# Altium footprint library Capacitance_PcbLib.PcbLib: 22 footprints (part 1 of 2)
Each footprint in its own frame and in the unit in brackets; x right, y up, seen from the top. Pads: shape width x height; smd on the part's side, far side on the other; paste and mask are expansions set on the pad; w line width, h text height; cw(c..) or ccw(c..) is an arc to the next point about the centre after c.
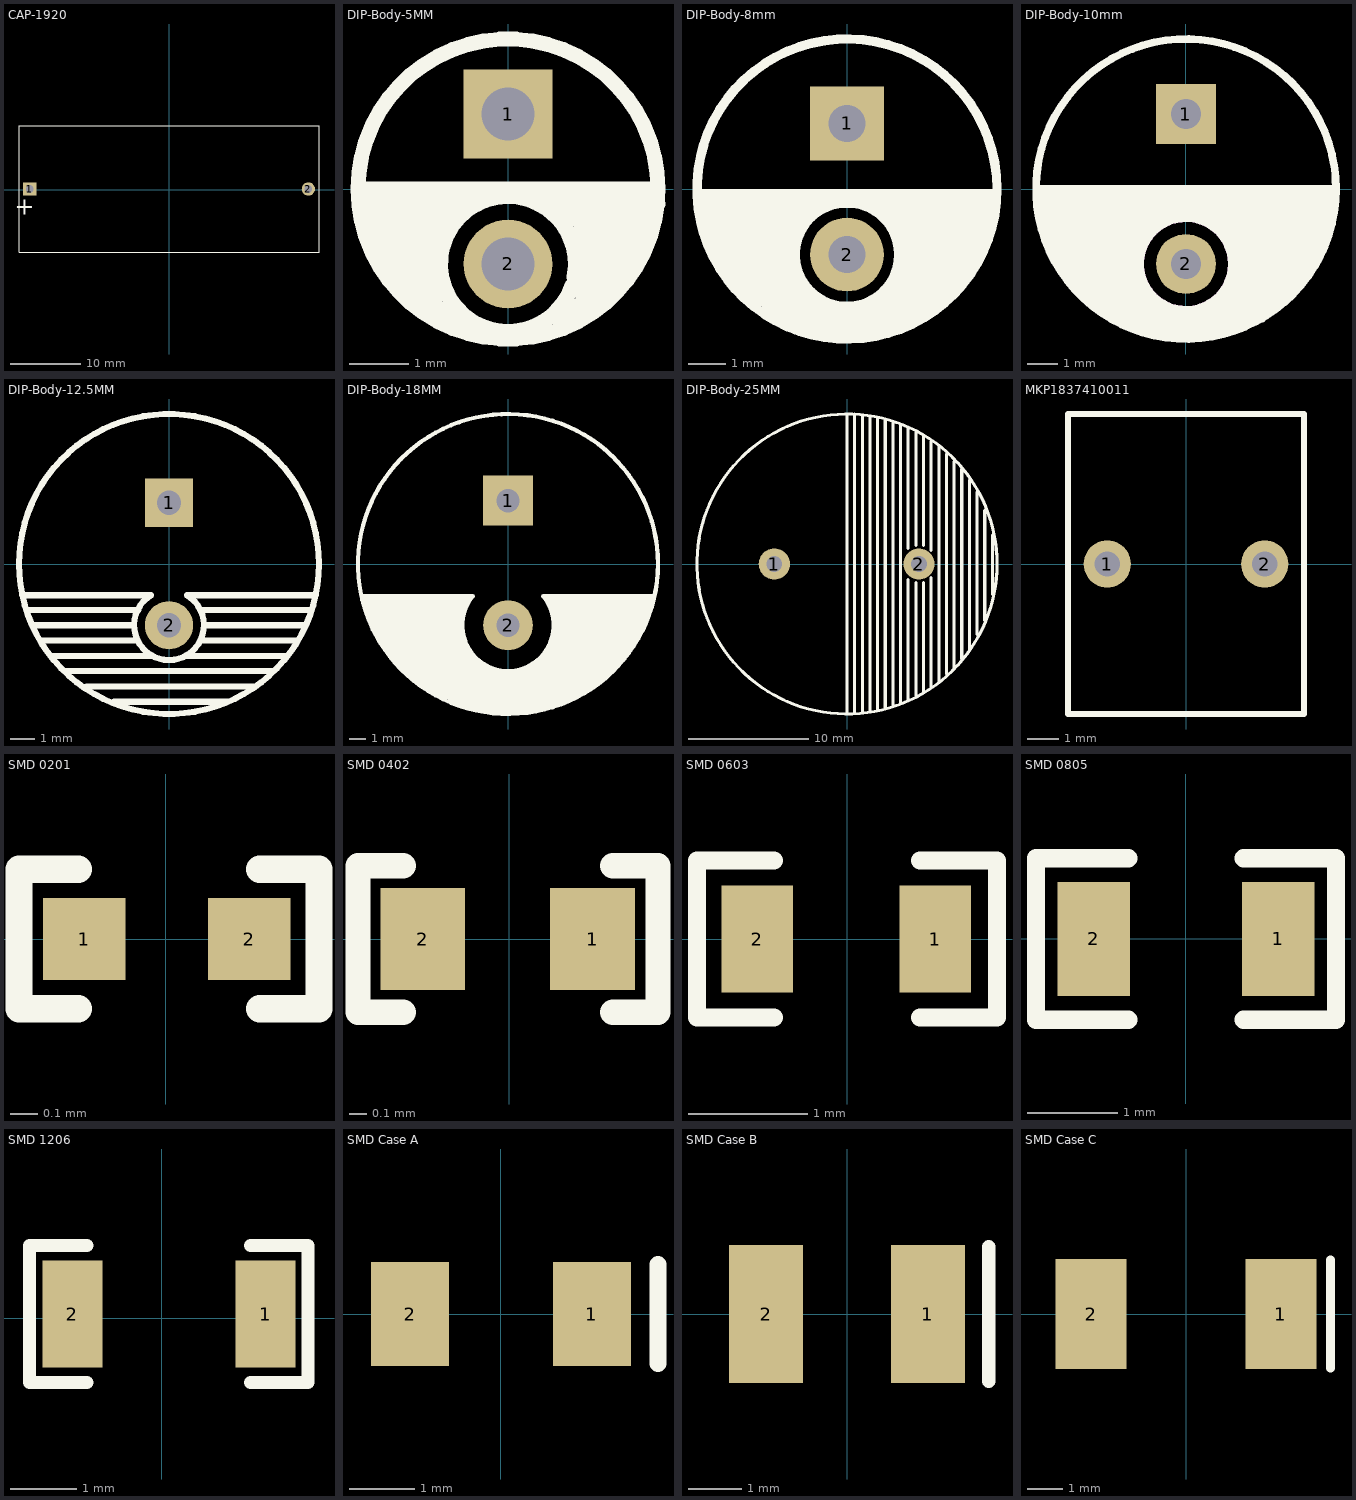
[diagram p0: the footprints below, top view; thin cyan lines are the x and y axes]

## CAP-1920 [mm] "電解電容器 - 帶引線 18x41"
pads (2):
  rect 1.9x1.9 hole 1.1: 1(-19.939,0.127)
  round 1.9 hole 1.1: 2(19.939,0.127)
Top Overlay:
  lines w0.15: -21.463,-8.89 -21.463,9.144 21.463,9.144 21.463,-8.89 -21.463,-8.89
  text "+" at -19.177,-3.556 h2.5
3D body: height 19, standoff -5, extent -20.5,-8.89 20.5,9.11

## DIP-Body-5MM [mm] "電解電容，直®"
pads (2):
  rect 1.5x1.5 hole 0.9: 1(0,1.27)
  round 1.5 hole 0.9: 2(0,-1.27)
Top Overlay:
  circle w0.254: c0,0 r2.54
  lines w0.254: -2.54,0 2.54,0 ; -2.413,-0.762 -1.016,-0.762 ; -2.413,-0.508 -0.889,-0.508 ; -2.413,-0.254 -0.508,-0.254 ; -2.286,-1.016 -1.143,-1.016 ; -2.159,-1.27 -1.143,-1.27 ; -2.032,-1.524 -1.143,-1.524 ; -1.778,-1.778 -1.143,-1.778 ; -1.524,-1.778 -1.524,-1.905 -1.397,-2.032 -1.016,-2.032 -1.016,-2.286 -0.762,-2.286 ; 0.508,-0.254 2.54,-0.254 ; 0.889,-2.286 1.27,-1.905 1.397,-1.905 1.651,-1.651 ; 0.889,-0.508 2.413,-0.508 ; 1.084,-1.631 cw(c0,-1.27) 1.121,-1.494 ; 1.143,-0.889 1.143,-0.762 2.413,-0.762 ; 1.27,-2.159 1.27,-1.016 2.286,-1.016 ; 1.27,-1.651 1.778,-1.651 ; 1.27,-1.397 2.032,-1.397 ; 1.27,-1.27 1.905,-1.27 ; 1.905,-1.524 1.905,-1.27 ; 2.159,-1.016 1.905,-1.27
3D body: height 11.35, standoff -2.45, extent -2.5,-2.502 2.5,2.5

## DIP-Body-8mm [mm] "電解電容，直®"
pads (2):
  rect 2x2 hole 1: 1(0,1.778)
  round 2 hole 1: 2(0,-1.778)
Top Overlay:
  circle w0.254: c0,-1.778 r1.403
  circle w0.254: c0,0 r4.064
  lines w0.254: -4.064,-0.127 3.937,-0.127 ; -3.937,-0.381 3.937,-0.381 ; -3.81,-1.397 -1.397,-1.397 ; -3.81,-1.143 -1.27,-1.143 ; -3.683,-1.651 -1.397,-1.651 ; -3.556,-1.905 -1.397,-1.905 ; -3.429,-2.159 -1.397,-2.159 ; -3.175,-2.413 -2.921,-2.413 -1.27,-2.413 ; -3.048,-2.667 -1.143,-2.667 ; -2.794,-2.794 -1.016,-2.794 ; -2.667,-3.048 -0.889,-3.048 -0.635,-3.302 ; -2.286,-3.302 2.159,-3.302 2.413,-3.048 ; -1.905,-3.556 1.905,-3.556 ; -1.397,-3.81 1.397,-3.81 ; -1.143,-0.889 -3.81,-0.889 -3.937,-0.762 -3.937,-0.635 -0.889,-0.635 ; 0.635,-3.048 2.54,-3.048 ; 0.889,-0.635 3.937,-0.635 ; 1.016,-2.921 2.667,-2.921 ; 1.143,-2.794 2.921,-2.794 ; 1.143,-0.889 3.937,-0.889 ; 1.27,-2.54 3.048,-2.54 3.048,-2.286 ; 1.27,-1.143 3.81,-1.143 ; 1.397,-2.286 3.302,-2.286 ; 1.397,-1.397 3.81,-1.397 ; 1.403,-1.778 3.556,-1.778 ; 1.524,-2.159 1.524,-2.032 3.429,-2.032 ; 1.53,-1.651 3.683,-1.651
3D body: height 14.4, standoff -2.9, extent -4.1,-4.17 4.1,4.03

## DIP-Body-10mm [mm] "電解電容，直®"
pads (2):
  rect 2x2 hole 1: 1(0,2.5)
  round 2 hole 1: 2(0,-2.5)
Top Overlay:
  circle w0.254: c0,0 r5
  circle w0.254: c0,-2.5 r1.526
  lines w0.25: -4.953,0 5,0
  lines w0.254: -4.953,-0.508 4.953,-0.508 ; -4.953,-0.254 4.953,-0.254 ; -4.826,-1.016 -0.381,-1.016 ; -4.826,-0.762 4.826,-0.762 ; -4.699,-1.524 -1.27,-1.524 ; -4.699,-1.27 -1.016,-1.27 -0.762,-1.016 ; -4.572,-1.778 -1.397,-1.778 ; -4.445,-2.032 -1.524,-2.032 ; -4.318,-2.286 -1.524,-2.286 ; -4.191,-2.54 -1.524,-2.54 ; -4.064,-2.794 -1.524,-2.794 ; -3.937,-3.048 -1.524,-3.048 ; -3.683,-3.302 -1.397,-3.302 ; -3.429,-3.556 -1.27,-3.556 ; -3.175,-3.81 -1.27,-3.81 ; -2.794,-4.064 -0.381,-4.064 2.794,-4.064 ; -2.413,-4.318 2.54,-4.318 ; -1.905,-4.572 1.778,-4.572 2.032,-4.318 ; -1.524,-3.556 -1.27,-3.556 ; -1.27,-4.826 1.143,-4.826 ; -1.27,-3.683 -1.27,-3.556 ; -1.016,-3.81 -1.27,-3.81 ; -0.762,-3.81 -1.27,-3.81 ; 0.381,-1.016 4.826,-1.016 ; 0.762,-3.81 3.175,-3.81 ; 0.889,-1.27 4.826,-1.27 ; 1.143,-3.683 3.048,-3.683 3.302,-3.429 ; 1.27,-3.429 3.302,-3.429 ; 1.27,-1.524 4.699,-1.524 ; 1.397,-3.175 3.556,-3.175 3.81,-2.921 ; 1.397,-1.778 4.572,-1.778 ; 1.524,-2.921 3.81,-2.921 ; 1.524,-2.667 4.064,-2.667 3.81,-2.921 ; 1.524,-2.286 4.445,-2.286 ; 1.524,-2.032 4.572,-2.032 ; 1.526,-2.5 4.231,-2.5 ; 1.651,-4.445 1.651,-4.318 2.032,-4.318 ; 1.905,-4.318 2.032,-4.318 ; 3.81,-3.175 3.556,-3.429 3.302,-3.429 ; -4.953,0 ccw(c0.024,0.021) 5,0 -4.953,0
Top Overlay keep-out:
  circle w0.254: c0,-2.5 r1.526
3D body: height 13.03, standoff -3.48, extent -5.025,-5.095 5.026,4.955

## DIP-Body-12.5MM [mm] "電解電容，直®"
pads (2):
  rect 2x2 hole 1: 1(0,2.54)
  round 2 hole 1: 2(0,-2.54)
Top Overlay:
  circle w0.254: c0,0 r6.223
  lines w0.254: -6.068,-1.298 -0.745,-1.298 ccw(c0,-2.54) 0.745,-1.298 6.068,-1.298 ; -5.842,-1.905 -1.27,-1.905 ; -5.588,-2.54 -1.524,-2.54 ; -5.334,-3.175 -1.397,-3.175 ; -4.826,-3.81 -0.762,-3.81 ; -4.318,-4.445 4.318,-4.445 ; -3.429,-5.08 3.556,-5.08 ; -2.286,-5.715 2.413,-5.715 ; 0.762,-3.81 4.826,-3.81 ; 1.397,-3.175 5.334,-3.175 ; 1.397,-1.905 5.842,-1.905 ; 1.524,-2.54 5.588,-2.54
3D body: height 20.5, standoff -3.5, extent -6.23,-6.252 6.231,6.25

## DIP-Body-18MM [mm] "電解電容，直®"
pads (2):
  rect 3x3 hole 1.4: 1(0,3.81)
  round 3 hole 1.4: 2(0,-3.683)
Top Overlay:
  circle w0.254: c0,0 r9.017
  lines w0.254: -8.763,-2.159 -2.286,-2.159 ; -8.732,-1.936 -2.121,-1.936 ccw(c0,-3.683) 2.121,-1.936 8.732,-1.936 ; -8.636,-2.413 -2.54,-2.413 -2.54,-2.54 ; -8.509,-2.921 -2.667,-2.921 ; -8.509,-2.667 -2.667,-2.667 ; -8.382,-3.175 -2.794,-3.175 ; -8.255,-3.429 -2.794,-3.429 ; -8.128,-3.937 -2.794,-3.937 ; -8.128,-3.683 -2.794,-3.683 ; -7.874,-4.191 -2.794,-4.191 ; -7.747,-4.445 -2.667,-4.445 ; -7.62,-4.699 -2.667,-4.699 ; -7.493,-4.953 -2.54,-4.953 ; -7.366,-5.207 -2.286,-5.207 ; -7.112,-5.461 -2.159,-5.461 ; -6.985,-5.715 -1.905,-5.715 ; -6.731,-5.969 -1.651,-5.969 ; -6.477,-6.223 -1.27,-6.223 ; -6.223,-6.477 6.223,-6.477 ; -5.969,-6.731 5.969,-6.731 ; -5.715,-6.985 5.715,-6.985 ; -5.334,-7.239 5.334,-7.239 ; -4.953,-7.493 4.953,-7.493 4.445,-7.493 4.445,-7.747 -4.572,-7.747 ; -4.318,-7.874 4.318,-7.874 ; -4.064,-8.001 4.064,-8.001 ; -3.556,-8.255 3.556,-8.255 ; -2.921,-8.509 2.667,-8.509 2.921,-8.255 3.175,-8.255 ; -2.032,-8.636 -2.032,-8.509 ; -1.905,-8.763 2.032,-8.763 2.032,-8.509 ; -1.524,-6.096 -1.524,-6.223 -1.143,-6.223 -1.143,-6.477 ; 1.143,-6.223 6.477,-6.223 ; 1.524,-5.969 6.731,-5.969 ; 1.905,-5.715 6.985,-5.715 ; 2.159,-5.461 7.112,-5.461 ; 2.286,-5.207 7.239,-5.207 7.239,-4.953 ; 2.286,-2.159 8.636,-2.159 ; 2.54,-4.953 7.493,-4.953 ; 2.54,-4.699 7.62,-4.699 ; 2.54,-2.413 8.636,-2.413 ; 2.667,-4.445 7.747,-4.445 ; 2.667,-2.921 8.509,-2.921 ; 2.667,-2.667 8.509,-2.667 ; 2.794,-4.191 7.874,-4.191 7.874,-4.064 ; 2.794,-3.937 8.001,-3.937 8.001,-3.81 ; 2.794,-3.683 8.128,-3.683 ; 2.794,-3.429 8.255,-3.429 ; 2.794,-3.175 8.382,-3.175
3D body: height 27, standoff -3, extent -9,-9.002 9,9

## DIP-Body-25MM [mm] "電解電容，直®"
pads (2):
  round 2.6 hole 1.3: 1(-6.031,0) 2(5.969,0)
Top Overlay:
  circle w0.254: c0,0 r12.449
  lines w0.254: 0,-12.446 0,12.446 ; 0.635,-12.319 0.635,12.446 ; 1.27,-12.319 1.27,12.319 ; 1.905,-12.192 1.905,12.192 ; 2.54,-12.065 2.54,12.065 ; 3.175,-11.938 3.175,11.938 ; 3.81,-11.811 3.81,11.811 ; 4.445,-11.557 4.445,11.557 ; 5.08,-11.303 5.08,-1.27 ; 5.08,1.27 5.08,11.303 ; 5.715,-10.922 5.715,-1.524 ; 5.715,1.524 5.715,10.922 ; 6.35,-10.668 6.35,-1.524 ; 6.35,1.524 6.35,10.668 ; 6.985,-10.287 6.985,-1.143 ; 6.985,1.143 6.985,10.16 ; 7.62,-9.779 7.62,9.779 ; 8.255,-9.144 8.255,9.144 ; 8.89,-8.636 8.89,8.509 ; 9.525,-7.874 9.525,7.874 ; 10.16,-7.112 10.16,6.985 ; 10.795,-5.842 10.795,5.969 ; 11.43,-4.699 11.43,4.445 ; 12.065,-2.54 12.065,2.413
3D body: height 42.2, standoff -2.5, extent -12.7,-12.787 12.7,12.613

## MKP1837410011 [mm]
pads (2):
  round 1.5 hole 0.8: 1(-2.5,0) 2(2.5,0)
Top Overlay:
  lines w0.2: -3.746,-4.763 3.746,-4.763 3.746,4.763 -3.746,4.763 -3.746,-4.763
3D body: height 11, standoff -6, extent -3.5,-4.5 3.5,4.5

## SMD 0201 [mm] "SMD 0201"
pads (2):
  rect 0.3x0.3 smd mask+0.05: 1(-0.295,0) 2(0.305,0)
Top Overlay:
  lines w0.1: -0.318,-0.254 -0.533,-0.254 -0.533,0.254 -0.318,0.254 ; 0.343,-0.254 0.559,-0.254 0.559,0.254 0.343,0.254
3D body: height 0.27, standoff -0.03, extent -0.3,-0.15 0.3,0.15

## SMD 0402 [mm] "SMD 0603"
pads (2):
  rect 0.5x0.6 smd mask+0.05: 1(0.492,0) 2(-0.508,0)
Top Overlay:
  lines w0.15: -0.622,-0.432 -0.889,-0.432 -0.889,0.432 -0.622,0.432 ; 0.61,-0.432 0.876,-0.432 0.876,0.432 0.61,0.432
3D body: height 0.48, standoff -0.02, extent -0.513,-0.25 0.487,0.25

## SMD 0603 [mm] "SMD 0805"
pads (2):
  rect 0.6x0.9 smd: 1(0.744,0) 2(-0.756,0)
Top Overlay:
  lines w0.15: -0.616,-0.66 -1.264,-0.66 -1.264,0.66 -0.616,0.66 ; 0.616,-0.66 1.264,-0.66 1.264,0.66 0.616,0.66
3D body: height 0.79, standoff -0.01, extent -0.794,-0.4 0.806,0.4

## SMD 0805 [mm] "SMD 0805"
pads (2):
  rect 0.8x1.25 smd: 1(1.016,0) 2(-1.016,0)
Top Overlay:
  lines w0.2: -0.635,-0.889 -1.651,-0.889 -1.651,0.889 -0.635,0.889 ; 0.635,-0.889 1.651,-0.889 1.651,0.889 0.635,0.889
3D body: height 0.6, standoff 0, extent -1,-0.625 1,0.625

## SMD 1206 [mm] "SMD 1206"
pads (2):
  rect 0.9x1.6 smd: 1(1.562,0.064) 2(-1.338,0.064)
Top Overlay:
  lines w0.2: -1.118,-0.965 -1.981,-0.965 -1.981,1.092 -1.118,1.092 ; 1.333,-0.965 2.197,-0.965 2.197,1.092 1.333,1.092
3D body: height 0.75, standoff -0.02, extent -1.473,-0.737 1.727,0.864

## SMD Case A [mm] "Case A 尺寸"
pads (2):
  rect 1.2x1.6 smd: 1(1.397,0) 2(-1.397,0)
Top Overlay:
  lines w0.254: 2.413,-0.762 2.413,0.762
3D body: height 1.65, standoff 0, extent -1.681,-0.796 1.709,0.804

## SMD Case B [mm] "Case B 尺寸"
pads (2):
  rect 1.4x2.6 smd: 1(1.524,0) 2(-1.524,0)
Top Overlay:
  lines w0.254: 2.667,-1.27 2.667,1.27
3D body: height 2.09, standoff -0.01, extent -1.845,-1.397 1.845,1.423

## SMD Case C [mm] "Case C尺寸"
pads (2):
  rect 2x3.1 smd: 1(2.667,0) 2(-2.667,0)
Top Overlay:
  lines w0.254: 4.064,-1.524 4.064,1.524
3D body: height 2.67, standoff -0.02, extent -3.093,-1.605 3.093,1.6